# Altium footprint library 3D_MIG_Controller.PCBLIB: 560 footprints (part 33 of 35)
Each footprint in its own frame and in the unit in brackets; x right, y up, seen from the top. Pads: shape width x height; smd on the part's side, far side on the other; paste and mask are expansions set on the pad; w line width, h text height; cw(c..) or ccw(c..) is an arc to the next point about the centre after c.
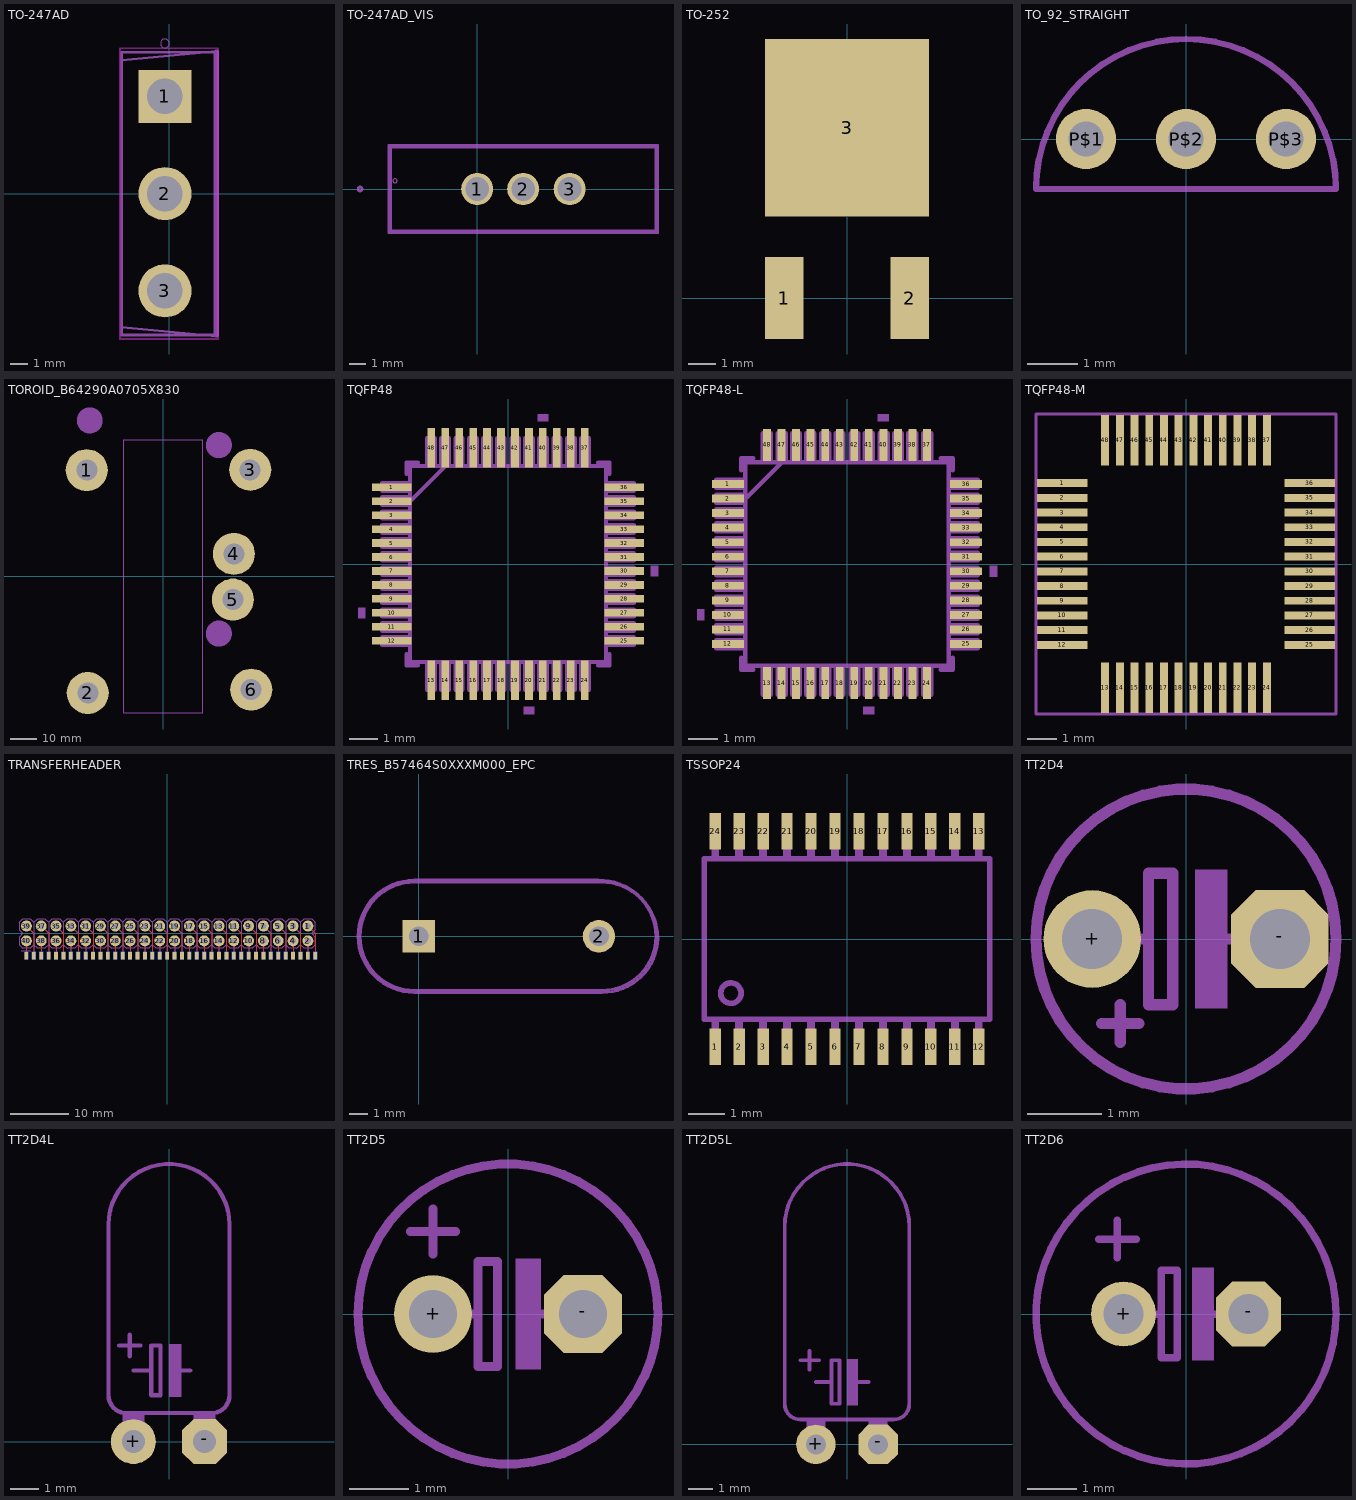
[diagram p32: the footprints below, top view; thin cyan lines are the x and y axes]

## TO-247AD [mm]
pads (3):
  rect 2.985x2.985 / inner round 2.758 / far side rect 2.985x2.985 hole 1.99: 1(-0.227,5.46)
  round 2.985 hole 1.99: 2(-0.227,0) 3(-0.227,-5.46)
Top keep-out:
  lines w0.1: -2.755,-8.162 -2.755,8.162 2.755,8.162 2.755,-8.162 -2.755,-8.162
tDocu:
  lines w0.15: -2.655,-7.935 -2.655,7.935 2.655,7.935 2.655,-7.935 -2.655,-7.935
tPlace:
  circle w0: c-0.227,8.435 r0.25
  lines w0.15: 2.655,-8 -2.655,-7.5 -2.655,7.5 2.655,8
  lines w0.3: 2.655,-7.935 2.655,7.935

## TO-247AD_VIS [mil]
pads (3):
  round 78 hole 58: 1(0,0) 2(112,0) 3(225,0)
tDocu:
  lines w0: -205,20 ccw(c-200,20) -195,20 ccw(c-200,20) -205,20
  lines w6: -210,-102 435,-102 435,102 -210,102 -210,-102
tPlace:
  lines w6: -290,0 ccw(c-285,0) -280,0 ccw(c-285,0) -290,0 ; -215,-106 440,-106 440,106 -215,106 -215,-106

## TO-252 [mm]
pads (3):
  rect 1.4x3 smd: 1(-2.3,0) 2(2.3,0)
  rect 6x6.5 smd: 3(0,6.25)

## TO_92_STRAIGHT [mm]
pads (3):
  round 1.208 hole 0.7: P$1(-2,0) P$2(0,0) P$3(2,0)
tPlace:
  lines w0.127: -3,-1 cw(c0,-1) 3,-1 -3,-1

## TOROID_B64290A0705X830 [mil]
pads (6):
  round 629.92 hole 314.96: 1(-1150,1590) 2(-1135,-1750) 3(1300,1595) 4(1055,335) 5(1040,-350) 6(1315,-1700)
tPlace:
  circle w196.85: c-1105,2335 r96.05
  circle w196.85: c830,1965 r96.05
  circle w196.85: c830,-860 r96.05
  lines w3.94: -592.76,-2047.24 590.55,-2047.24 590.55,2047.24 -590.55,2047.24 -592.76,2045.04 -592.76,-2047.24

## TQFP48 [mm]
pads (48):
  rect 1.411x0.27 smd: 1(-4.15,2.75) 2(-4.15,2.25) 3(-4.15,1.75) 4(-4.15,1.25) 5(-4.15,0.75) 6(-4.15,0.25) 7(-4.15,-0.25) 8(-4.15,-0.75) 9(-4.15,-1.25) 10(-4.15,-1.75) 11(-4.15,-2.25) 12(-4.15,-2.75) 25(4.15,-2.75) 26(4.15,-2.25) 27(4.15,-1.75) 28(4.15,-1.25) 29(4.15,-0.75) 30(4.15,-0.25) 31(4.15,0.25) 32(4.15,0.75) 33(4.15,1.25) 34(4.15,1.75) 35(4.15,2.25) 36(4.15,2.75)
  rect 0.27x1.411 smd: 13(-2.75,-4.15) 14(-2.25,-4.15) 15(-1.75,-4.15) 16(-1.25,-4.15) 17(-0.75,-4.15) 18(-0.25,-4.15) 19(0.25,-4.15) 20(0.75,-4.15) 21(1.25,-4.15) 22(1.75,-4.15) 23(2.25,-4.15) 24(2.75,-4.15) 37(2.75,4.15) 38(2.25,4.15) 39(1.75,4.15) 40(1.25,4.15) 41(0.75,4.15) 42(0.25,4.15) 43(-0.25,4.15) 44(-0.75,4.15) 45(-1.25,4.15) 46(-1.75,4.15) 47(-2.25,4.15) 48(-2.75,4.15)
tDocu:
  drawing of 199 lines, arcs and shapes, not listed
  text "*" at -3.683,2.362 h1.57
tPlace:
  region: -5.364,-1.56 -5.364,-1.941 -5.11,-1.941 -5.11,-1.56
  region: 0.56,-5.11 0.56,-5.364 0.941,-5.364 0.941,-5.11
  region: 5.364,-0.059 5.364,-0.44 5.11,-0.44 5.11,-0.059
  region: 1.059,5.11 1.059,5.364 1.44,5.364 1.44,5.11
  lines w0.152: -3.632,-3.226 -3.632,-3.632 -3.226,-3.632 ; -3.632,3.226 -3.632,3.632 -3.226,3.632 ; 3.226,-3.632 3.632,-3.632 3.632,-3.226 ; 3.226,3.632 3.632,3.632 3.632,3.226
  text "*" at -6.071,2.743 h1.57

## TQFP48-L [mm]
pads (48):
  rect 1.106x0.27 smd: 1(-4.099,2.75) 2(-4.099,2.25) 3(-4.099,1.75) 4(-4.099,1.25) 5(-4.099,0.75) 6(-4.099,0.25) 7(-4.099,-0.25) 8(-4.099,-0.75) 9(-4.099,-1.25) 10(-4.099,-1.75) 11(-4.099,-2.25) 12(-4.099,-2.75) 25(4.099,-2.75) 26(4.099,-2.25) 27(4.099,-1.75) 28(4.099,-1.25) 29(4.099,-0.75) 30(4.099,-0.25) 31(4.099,0.25) 32(4.099,0.75) 33(4.099,1.25) 34(4.099,1.75) 35(4.099,2.25) 36(4.099,2.75)
  rect 0.27x1.106 smd: 13(-2.75,-4.099) 14(-2.25,-4.099) 15(-1.75,-4.099) 16(-1.25,-4.099) 17(-0.75,-4.099) 18(-0.25,-4.099) 19(0.25,-4.099) 20(0.75,-4.099) 21(1.25,-4.099) 22(1.75,-4.099) 23(2.25,-4.099) 24(2.75,-4.099) 37(2.75,4.099) 38(2.25,4.099) 39(1.75,4.099) 40(1.25,4.099) 41(0.75,4.099) 42(0.25,4.099) 43(-0.25,4.099) 44(-0.75,4.099) 45(-1.25,4.099) 46(-1.75,4.099) 47(-2.25,4.099) 48(-2.75,4.099)
tDocu:
  drawing of 199 lines, arcs and shapes, not listed
  text "*" at -3.683,2.362 h1.57
tPlace:
  region: -5.161,-1.56 -5.161,-1.941 -4.907,-1.941 -4.907,-1.56
  region: 0.56,-4.907 0.56,-5.161 0.941,-5.161 0.941,-4.907
  region: 5.161,-0.059 5.161,-0.44 4.907,-0.44 4.907,-0.059
  region: 1.059,4.907 1.059,5.161 1.44,5.161 1.44,4.907
  lines w0.152: -3.632,-3.226 -3.632,-3.632 -3.226,-3.632 ; -3.632,3.226 -3.632,3.632 -3.226,3.632 ; 3.226,-3.632 3.632,-3.632 3.632,-3.226 ; 3.226,3.632 3.632,3.632 3.632,3.226
  text "*" at -5.867,2.743 h1.57

## TQFP48-M [mm]
pads (48):
  rect 1.716x0.27 smd: 1(-4.201,2.75) 2(-4.201,2.25) 3(-4.201,1.75) 4(-4.201,1.25) 5(-4.201,0.75) 6(-4.201,0.25) 7(-4.201,-0.25) 8(-4.201,-0.75) 9(-4.201,-1.25) 10(-4.201,-1.75) 11(-4.201,-2.25) 12(-4.201,-2.75) 25(4.201,-2.75) 26(4.201,-2.25) 27(4.201,-1.75) 28(4.201,-1.25) 29(4.201,-0.75) 30(4.201,-0.25) 31(4.201,0.25) 32(4.201,0.75) 33(4.201,1.25) 34(4.201,1.75) 35(4.201,2.25) 36(4.201,2.75)
  rect 0.27x1.716 smd: 13(-2.75,-4.201) 14(-2.25,-4.201) 15(-1.75,-4.201) 16(-1.25,-4.201) 17(-0.75,-4.201) 18(-0.25,-4.201) 19(0.25,-4.201) 20(0.75,-4.201) 21(1.25,-4.201) 22(1.75,-4.201) 23(2.25,-4.201) 24(2.75,-4.201) 37(2.75,4.201) 38(2.25,4.201) 39(1.75,4.201) 40(1.25,4.201) 41(0.75,4.201) 42(0.25,4.201) 43(-0.25,4.201) 44(-0.75,4.201) 45(-1.25,4.201) 46(-1.75,4.201) 47(-2.25,4.201) 48(-2.75,4.201)
tPlace:
  lines w0.1: -5.1,-5.1 5.1,-5.1 5.1,5.1 -5.1,5.1 -5.1,-5.1
  text "*" at -4.272,3.281 h1.57

## TRANSFERHEADER [mil]
pads (120):
  round 74 hole 39.37: 1(950,50) 2(950,-50) 3(850,50) 4(850,-50) 5(750,50) 6(750,-50) 7(650,50) 8(650,-50) 9(550,50) 10(550,-50) 11(450,50) 12(450,-50) 13(350,50) 14(350,-50) 15(250,50) 16(250,-50) 17(150,50) 18(150,-50) 19(50,50) 20(50,-50) 21(-50,50) 22(-50,-50) 23(-150,50) 24(-150,-50) 25(-250,50) 26(-250,-50) 27(-350,50) 28(-350,-50) 29(-450,50) 30(-450,-50) 31(-550,50) 32(-550,-50) 33(-650,50) 34(-650,-50) 35(-750,50) 36(-750,-50) 37(-850,50) 38(-850,-50) 39(-950,50) 40(-950,-50)
  rect 25x50 smd: P1(1000,-150) P2(950,-150) P3(900,-150) P4(850,-150) P5(800,-150) P6(750,-150) P7(700,-150) P8(650,-150) P9(600,-150) P10(550,-150) P11(500,-150) P12(450,-150) P13(400,-150) P14(350,-150) P15(300,-150) P16(250,-150) P17(200,-150) P18(150,-150) P19(100,-150) P20(50,-150) P21(0,-150) P22(-50,-150) P23(-100,-150) P24(-150,-150) P25(-200,-150) P26(-250,-150) P27(-300,-150) P28(-350,-150) P29(-400,-150) P30(-450,-150) P31(-500,-150) P32(-550,-150) P33(-600,-150) P34(-650,-150) P35(-700,-150) P36(-750,-150) P37(-800,-150) P38(-850,-150) P39(-900,-150) P40(-950,-150)
  rect 25x50 smd far side: P$1(-950,-150) P$2(-900,-150) P$3(-850,-150) P$4(-800,-150) P$5(-750,-150) P$6(-700,-150) P$7(-650,-150) P$8(-600,-150) P$9(-550,-150) P$10(-500,-150) P$11(-450,-150) P$12(-400,-150) P$13(-350,-150) P$14(-300,-150) P$15(-250,-150) P$16(-200,-150) P$17(-150,-150) P$18(-100,-150) P$19(-50,-150) P$20(0,-150) P$21(50,-150) P$22(100,-150) P$23(150,-150) P$24(200,-150) P$25(250,-150) P$26(300,-150) P$27(350,-150) P$28(400,-150) P$29(450,-150) P$30(500,-150) P$31(550,-150) P$32(600,-150) P$33(650,-150) P$34(700,-150) P$35(750,-150) P$36(800,-150) P$37(850,-150) P$38(900,-150) P$39(950,-150) P$40(1000,-150)
Top:
  lines w7.87: -950,-150 -950,-50 ; -950,50 -900,0 -900,-150 ; -850,-150 -850,-50 ; -850,50 -800,0 -800,-150 ; -750,-150 -750,-50 ; -750,50 -700,0 -700,-150 ; -650,-150 -650,-50 ; -650,50 -600,0 -600,-150 ; -550,-150 -550,-50 ; -550,50 -500,0 -500,-150 ; -450,-150 -450,-50 ; -450,50 -400,0 -400,-150 ; -350,-150 -350,-50 ; -350,50 -300,0 -300,-150 ; -250,-150 -250,-50 ; -250,50 -200,0 -200,-150 ; -150,-150 -150,-50 ; -150,50 -100,0 -100,-150 ; -50,-150 -50,-50 ; -50,50 0,0 0,-150 ; 50,-150 50,-50 ; 50,50 100,0 100,-150 ; 150,-150 150,-50 ; 150,50 200,0 200,-150 ; 250,-150 250,-50 ; 250,50 300,0 300,-150 ; 350,-150 350,-50 ; 350,50 400,0 400,-150 ; 450,-150 450,-50 ; 450,50 500,0 500,-150 ; 550,-150 550,-50 ; 550,50 600,0 600,-150 ; 650,-150 650,-50 ; 650,50 700,0 700,-150 ; 750,-150 750,-50 ; 750,50 800,0 800,-150 ; 850,-150 850,-50 ; 850,50 900,0 900,-150 ; 950,-150 950,-50 ; 950,50 1000,0 1000,-150
Bottom:
  lines w7.87: -950,-150 -950,-50 ; -950,50 -900,0 -900,-150 ; -850,-150 -850,-50 ; -850,50 -800,0 -800,-150 ; -750,-150 -750,-50 ; -750,50 -700,0 -700,-150 ; -650,-150 -650,-50 ; -650,50 -600,0 -600,-150 ; -550,-150 -550,-50 ; -550,50 -500,0 -500,-150 ; -450,-150 -450,-50 ; -450,50 -400,0 -400,-150 ; -350,-150 -350,-50 ; -350,50 -300,0 -300,-150 ; -250,-150 -250,-50 ; -250,50 -200,0 -200,-150 ; -150,-150 -150,-50 ; -150,50 -100,0 -100,-150 ; -50,-150 -50,-50 ; -50,50 0,0 0,-150 ; 50,-150 50,-50 ; 50,50 100,0 100,-150 ; 150,-150 150,-50 ; 150,50 200,0 200,-150 ; 250,-150 250,-50 ; 250,50 300,0 300,-150 ; 350,-150 350,-50 ; 350,50 400,0 400,-150 ; 450,-150 450,-50 ; 450,50 500,0 500,-150 ; 550,-150 550,-50 ; 550,50 600,0 600,-150 ; 650,-150 650,-50 ; 650,50 700,0 700,-150 ; 750,-150 750,-50 ; 750,50 800,0 800,-150 ; 850,-150 850,-50 ; 850,50 900,0 900,-150 ; 950,-150 950,-50 ; 950,50 1000,0 1000,-150
tDocu:
  drawing of 40 lines, arcs and shapes, not listed
tPlace:
  lines w8: -984.88,-115.37 -919.88,-115.37 ; -899.88,-75.37 -924.88,-100.37 -974.88,-100.37 -999.88,-75.37 -999.88,-25.37 -974.88,-0.37 -999.88,24.63 -999.88,74.63 -974.88,99.63 -924.88,99.63 -899.88,74.63 ; -899.88,-75.37 -874.88,-100.37 -824.88,-100.37 -799.88,-75.37 ; -899.88,-75.37 -899.88,74.63 ; -899.88,74.63 -874.88,99.63 -824.88,99.63 -799.88,74.63 ; -799.88,-75.37 -774.88,-100.37 -724.88,-100.37 -699.88,-75.37 ; -799.88,-75.37 -799.88,74.63 ; -799.88,74.63 -774.88,99.63 -724.88,99.63 -699.88,74.63 ; -699.88,-75.37 -674.88,-100.37 -624.88,-100.37 -599.88,-75.37 ; -699.88,-75.37 -699.88,74.63 ; -699.88,74.63 -674.88,99.63 -624.88,99.63 -599.88,74.63 ; -599.88,-75.37 -574.88,-100.37 -524.88,-100.37 -499.88,-75.37 ; -599.88,-75.37 -599.88,74.63 ; -599.88,74.63 -574.88,99.63 -524.88,99.63 -499.88,74.63 ; -499.88,-75.37 -474.88,-100.37 -424.88,-100.37 -399.88,-75.37 ; -499.88,-75.37 -499.88,74.63 ; -499.88,74.63 -474.88,99.63 -424.88,99.63 -399.88,74.63 ; -399.88,-75.37 -374.88,-100.37 -324.88,-100.37 -299.88,-75.37 ; -399.88,-75.37 -399.88,74.63 ; -399.88,74.63 -374.88,99.63 -324.88,99.63 -299.88,74.63 ; -299.88,-75.37 -274.88,-100.37 -224.88,-100.37 -199.88,-75.37 ; -299.88,-75.37 -299.88,74.63 ; -299.88,74.63 -274.88,99.63 -224.88,99.63 -199.88,74.63 ; -199.88,-75.37 -174.88,-100.37 -124.88,-100.37 -99.88,-75.37 ; -199.88,-75.37 -199.88,74.63 ; -199.88,74.63 -174.88,99.63 -124.88,99.63 -99.88,74.63 ; -99.88,-75.37 -74.88,-100.37 -24.88,-100.37 0.12,-75.37 ; -99.88,-75.37 -99.88,74.63 ; -99.88,74.63 -74.88,99.63 -24.88,99.63 0.12,74.63 ; 0.12,-75.37 25.12,-100.37 75.12,-100.37 100.12,-75.37 ; 0.12,-75.37 0.12,74.63 ; 0.12,74.63 25.12,99.63 75.12,99.63 100.12,74.63 ; 100.12,-75.37 125.12,-100.37 175.12,-100.37 200.12,-75.37 ; 100.12,-75.37 100.12,74.63 ; 100.12,74.63 125.12,99.63 175.12,99.63 200.12,74.63 ; 200.12,-75.37 225.12,-100.37 275.12,-100.37 300.12,-75.37 ; 200.12,-75.37 200.12,74.63 ; 200.12,74.63 225.12,99.63 275.12,99.63 300.12,74.63 ; 300.12,-75.37 300.12,74.63 ; 300.12,-75.37 325.12,-100.37 375.12,-100.37 400.12,-75.37 ; 300.12,74.63 325.12,99.63 375.12,99.63 400.12,74.63 ; 400.12,-75.37 400.12,74.63 ; 400.12,-75.37 425.12,-100.37 475.12,-100.37 500.12,-75.37 ; 400.12,74.63 425.12,99.63 475.12,99.63 500.12,74.63 ; 500.12,-75.37 500.12,74.63 ; 500.12,-75.37 525.12,-100.37 575.12,-100.37 600.12,-75.37 ; 500.12,74.63 525.12,99.63 575.12,99.63 600.12,74.63 ; 600.12,-75.37 600.12,74.63 ; 600.12,-75.37 625.12,-100.37 675.12,-100.37 700.12,-75.37 ; 600.12,74.63 625.12,99.63 675.12,99.63 700.12,74.63 ; 700.12,-75.37 700.12,74.63 ; 700.12,-75.37 725.12,-100.37 775.12,-100.37 800.12,-75.37 ; 700.12,74.63 725.12,99.63 775.12,99.63 800.12,74.63 ; 800.12,-75.37 800.12,74.63 ; 800.12,-75.37 825.12,-100.37 875.12,-100.37 900.12,-75.37 ; 800.12,74.63 825.12,99.63 875.12,99.63 900.12,74.63 ; 900.12,-75.37 900.12,74.63 ; 900.12,-75.37 925.12,-100.37 975.12,-100.37 1000.12,-75.37 1000.12,-25.37 975.12,-0.37 1000.12,24.63 1000.12,74.63 975.12,99.63 925.12,99.63 900.12,74.63
bPlace:
  lines w8: -984.88,-115.37 -919.88,-115.37

## TRES_B57464S0XXXM000_EPC [mil]
pads (2):
  rect 70.87x70.87 / inner round 65.48 / far side rect 70.87x70.87 hole 43.31: 1(0,0)
  round 70.87 hole 43.31: 2(393.7,0)
tDocu:
  lines w6: -10,-118 399.91,-118 ccw(c399.91,0) 399.91,118 -10,118 ccw(c-10,0) -10,-118
tPlace:
  lines w6: -10,-123 399.91,-123 ccw(c401.88,-1.97) 522.91,-3.94 ccw(c394,-5.91) 392.04,123 -10,123 ccw(c-10,0) -10,-123

## TSSOP24 [mil]
pads (24):
  rect 12x39 smd: 1(-140.75,-114.87) 2(-115.16,-114.87) 3(-89.57,-114.87) 4(-63.98,-114.87) 5(-38.39,-114.87) 6(-12.8,-114.87) 7(12.8,-114.87) 8(38.39,-114.87) 9(63.98,-114.87) 10(89.57,-114.87) 11(115.16,-114.87) 12(140.75,-114.87) 13(140.75,114.87) 14(115.16,114.87) 15(89.57,114.87) 16(63.98,114.87) 17(38.39,114.87) 18(12.8,114.87) 19(-12.8,114.87) 20(-38.39,114.87) 21(-63.98,114.87) 22(-89.57,114.87) 23(-115.16,114.87) 24(-140.75,114.87)
tDocu:
  region: -144.75,-122.87 -144.75,-88.58 -136.75,-88.58 -136.75,-122.87
  region: -119.16,-122.87 -119.16,-88.58 -111.16,-88.58 -111.16,-122.87
  region: -93.57,-122.87 -93.57,-88.58 -85.57,-88.58 -85.57,-122.87
  region: -67.98,-122.87 -67.98,-88.58 -59.98,-88.58 -59.98,-122.87
  region: -42.39,-122.87 -42.39,-88.58 -34.39,-88.58 -34.39,-122.87
  region: -16.8,-122.87 -16.8,-88.58 -8.8,-88.58 -8.8,-122.87
  region: 8.8,-122.87 8.8,-88.58 16.8,-88.58 16.8,-122.87
  region: 34.39,-122.87 34.39,-88.58 42.39,-88.58 42.39,-122.87
  region: 59.98,-122.87 59.98,-88.58 67.98,-88.58 67.98,-122.87
  region: 85.57,-122.87 85.57,-88.58 93.57,-88.58 93.57,-122.87
  region: 111.16,-122.87 111.16,-88.58 119.16,-88.58 119.16,-122.87
  region: 136.75,-122.87 136.75,-88.58 144.75,-88.58 144.75,-122.87
  region: 136.75,88.58 136.75,122.87 144.75,122.87 144.75,88.58
  region: 111.16,88.58 111.16,122.87 119.16,122.87 119.16,88.58
  region: 85.57,88.58 85.57,122.87 93.57,122.87 93.57,88.58
  region: 59.98,88.58 59.98,122.87 67.98,122.87 67.98,88.58
  region: 34.39,88.58 34.39,122.87 42.39,122.87 42.39,88.58
  region: 8.8,88.58 8.8,122.87 16.8,122.87 16.8,88.58
  region: -16.8,88.58 -16.8,122.87 -8.8,122.87 -8.8,88.58
  region: -42.39,88.58 -42.39,122.87 -34.39,122.87 -34.39,88.58
  region: -67.98,88.58 -67.98,122.87 -59.98,122.87 -59.98,88.58
  region: -93.57,88.58 -93.57,122.87 -85.57,122.87 -85.57,88.58
  region: -119.16,88.58 -119.16,122.87 -111.16,122.87 -111.16,88.58
  region: -144.75,88.58 -144.75,122.87 -136.75,122.87 -136.75,88.58
tPlace:
  circle w6: c-124.04,-57.84 r10.92
  lines w6: -152.56,-85.63 152.56,-85.63 152.56,85.63 -152.56,85.63 -152.56,-85.63

## TT2D4 [mil]
pads (2):
  round 52 hole 32: +(-50,0)
  oct 52x52 / inner round 48.04 / far side oct 52x52 hole 32: -(50,0)
tDocu:
  region: 5,-37 5,37 22,37 22,-37
  lines w6: -66.87,-43.91 cw(c0,0) -66.87,43.91 ; -40,0 -20,0 ; 20,0 40,0 ; 66.87,-43.91 ccw(c0,0) 66.87,43.91 ; -20,0 -20,-35 -7,-35 -7,35 -20,35 -20,0
tPlace:
  lines w6: -66.87,-43.91 ccw(c0,0) 66.87,-43.91 ; -66.87,43.91 cw(c0,0) 66.87,43.91 ; -45,-45 -25,-45 ; -35,-55 -35,-35

## TT2D4L [mil]
pads (2):
  round 63 hole 32: +(-50,0)
  oct 63x63 / inner round 58.2 / far side oct 63x63 hole 32: -(50,0)
tDocu:
  region: -65,25 -65,40 -35,40 -35,25
  region: 35,25 35,40 65,40 65,25
  region: 35,-5 35,25 65,25 65,-5
  region: -65,-5 -65,25 -35,25 -35,-5
tPlace:
  region: 0,63 0,137 17,137 17,63
  lines w6: -70,135 -40,135 ; -55,120 -55,150 ; -50,100 -25,100 ; 10,100 30,100 ; -25,100 -25,65 -12,65 -12,135 -25,135 -25,100 ; -85,65 ccw(c-60,65) -60,40 60,40 ccw(c60,65) 85,65 85,305 ccw(c0,305) -85,305 -85,65
  text "TT" at 75,70 h62

## TT2D5 [mil]
pads (2):
  round 52 hole 32: +(-50,0)
  oct 52x52 / inner round 48.04 / far side oct 52x52 hole 32: -(50,0)
tDocu:
  region: 5,-37 5,37 22,37 22,-37
  lines w6: -40,0 -20,0 ; 20,0 40,0 ; -20,0 -20,-35 -7,-35 -7,35 -20,35 -20,0
tPlace:
  circle w6: c0,0 r100
  lines w6: -65,55 -35,55 ; -50,40 -50,70
  text "TT" at -30,-85 h62

## TT2D5L [mil]
pads (2):
  round 63 hole 32: +(-50,0)
  oct 63x63 / inner round 58.2 / far side oct 63x63 hole 32: -(50,0)
tDocu:
  region: -65,25 -65,40 -35,40 -35,25
  region: 35,25 35,40 65,40 65,25
  region: 35,-5 35,25 65,25 65,-5
  region: -65,-5 -65,25 -35,25 -35,-5
tPlace:
  region: 0,63 0,137 17,137 17,63
  lines w6: -75,135 -45,135 ; -60,120 -60,150 ; -50,100 -25,100 ; 15,100 35,100 ; -25,100 -25,65 -12,65 -12,135 -25,135 -25,100 ; -100,65 -100,350 cw(c0,350) 100,350 100,65 cw(c75,65) 75,40 -75,40 cw(c-75,65) -100,65
  text "TT" at 90,65 h62

## TT2D6 [mil]
pads (2):
  round 52 hole 32: +(-50,0)
  oct 52x52 / inner round 48.04 / far side oct 52x52 hole 32: -(50,0)
tDocu:
  region: 5,-37 5,37 22,37 22,-37
  lines w6: -40,0 -20,0 ; 20,0 40,0 ; -20,0 -20,-35 -7,-35 -7,35 -20,35 -20,0
tPlace:
  circle w6: c0,0 r120
  lines w6: -70,60 -40,60 ; -55,45 -55,75
  text "TT" at 10,-90 h62